# Altium footprint library Selex_PCBLib.PcbLib: 388 footprints (part 22 of 25)
Each footprint in its own frame and in the unit in brackets; x right, y up, seen from the top. Pads: shape width x height; smd on the part's side, far side on the other; paste and mask are expansions set on the pad; w line width, h text height; cw(c..) or ccw(c..) is an arc to the next point about the centre after c.
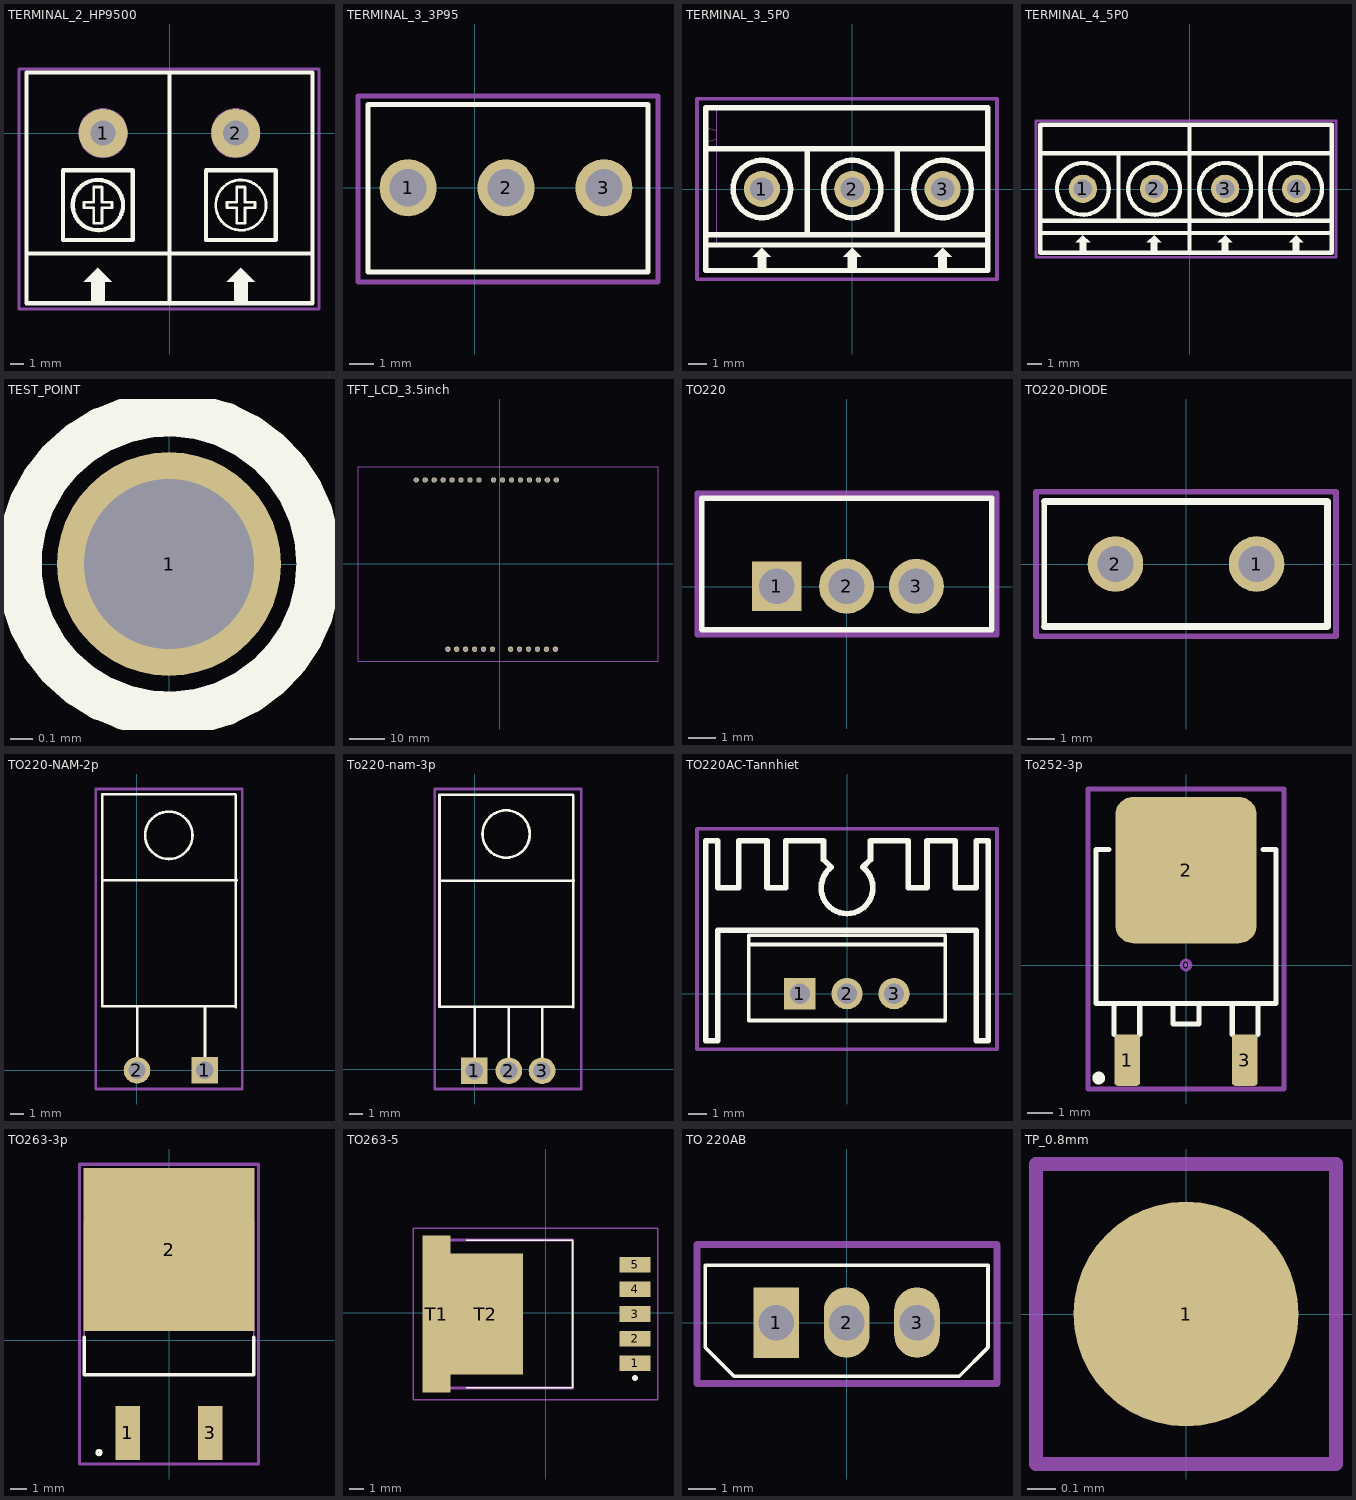
[diagram p21: the footprints below, top view; thin cyan lines are the x and y axes]

## TERMINAL_2_HP9500 [mm]
pads (2):
  round 3.5 hole 1.8 mask+0.05: 1(-4.77,0) 2(4.73,0)
Top Overlay:
  circle w0.3: c-5.145,-5.15 r1.803
  circle w0.2: c5.105,-5.15 r1.803
  rectangle: 4.605,-12.15 5.605,-10.45
  rectangle: -5.645,-12.15 -4.645,-10.45
  region: 5.105,-9.65 4.105,-10.65 6.105,-10.65
  region: -5.145,-9.65 -6.145,-10.65 -4.145,-10.65
  lines w0.2: -6.145,-5.35 -5.445,-5.35 -5.445,-6.45 -4.845,-6.45 -4.845,-5.35 -4.145,-5.35 -4.145,-4.95 -4.845,-4.95 -4.845,-4.15 -4.845,-3.85 -5.445,-3.85 -5.445,-4.95 -6.145,-4.95 -6.145,-5.35 ; 4.105,-5.35 4.105,-4.95 4.805,-4.95 4.805,-3.85 5.405,-3.85 5.405,-4.15 5.405,-4.95 6.105,-4.95 6.105,-5.35 5.405,-5.35 5.405,-6.45 4.805,-6.45 4.805,-5.35 4.105,-5.35
  lines w0.3: -10.27,-8.62 10.23,-8.62 ; -0.02,4.35 -0.02,-12.19 ; -0.02,-12.19 10.23,-12.19 10.23,4.35 -10.27,4.35 -10.27,-12.19 -0.02,-12.19 ; -7.645,-7.65 -7.645,-2.65 -2.645,-2.65 -2.645,-7.65 -7.645,-7.65 ; 2.605,-7.65 7.605,-7.65 7.605,-2.65 2.605,-2.65 2.605,-7.65
Mechanical 1:
  circle w0.05: c4.73,0 r1.75
  circle w0.05: c-4.77,0 r1.75
  lines w0.05: -10.27,-12.19 10.23,-12.19 10.23,4.35 -10.27,4.35 -10.27,-12.19
Mechanical 15:
  lines w0.2: -10.8,-12.6 10.7,-12.6 10.7,4.6 -10.8,4.6 -10.8,-12.6
3D body "User Library-Screw terminal block 9_5mm.step": height 19.5, standoff -4, extent -10.545,-12.15 10.505,4.35

## TERMINAL_3_3P95 [mm]
pads (3):
  round 2.3 hole 1.5: 1(-2.68,0) 2(1.27,0) 3(5.22,0)
Top Overlay:
  lines w0.2: -4.3,-3.4 -4.3,3.35 7,3.35 7,-3.4 -4.3,-3.4
Mechanical 15:
  lines w0.2: -4.7,-3.8 -4.7,3.7 7.4,3.7 7.4,-3.8 -4.7,-3.8
3D body "DG350-3.96-03P-12-00AH.STEP": height 8.4, standoff -3.5, extent -4.4,-3.45 7.1,3.35

## TERMINAL_3_5P0 [mm]
pads (3):
  round 2 hole 1.3 mask+0.1: 1(-5.01,0) 2(-0.01,0) 3(4.99,0)
Top Overlay:
  circle w0.3: c4.99,0 r1.587
  circle w0.3: c-0.01,0 r1.587
  circle w0.3: c-5.01,0 r1.587
  rectangle: -0.26,-4.508 0.24,-3.758
  rectangle: 4.74,-4.508 5.24,-3.758
  rectangle: -5.26,-4.508 -4.76,-3.758
  region: -0.51,-3.758 -0.01,-3.258 0.49,-3.758
  region: 4.49,-3.758 4.99,-3.258 5.49,-3.758
  region: -5.51,-3.758 -5.01,-3.258 -4.51,-3.758
  lines w0.3: -8.11,-2.54 7.49,-2.54 ; -8.11,2.222 7.49,2.222 ; -2.51,-2.5 -2.51,2.222 ; 2.49,-2.54 2.49,2.222 ; -8.11,-3.1 -8.11,-4.508 7.49,-4.508 7.49,-3.1 ; -8.11,-3.1 -8.11,4.5 7.49,4.5 7.49,-3.1 ; -8.11,-3.1 7.49,-3.1
Mechanical 1:
  circle w0.2: c-5.01,0 r1.587
  circle w0.05: c-0.01,0 r1.587
  circle w0.05: c4.99,0 r1.587
  lines w0.05: -7.51,-2.54 7.49,-2.54 ; -7.51,2.222 7.49,2.222 ; -7.51,2.786 -8.11,2.595 -8.11,3.421 -7.51,3.23 ; -2.51,-2.54 -2.51,2.222 ; 2.49,-2.5 2.49,2.222 ; -7.51,-3.1 -7.51,4.5 7.49,4.5 7.49,-3.1 -7.51,-3.1
  text "1" at -5.201,-0.572 h1.2
  text "2" at -0.375,-0.572 h1.2
  text "3" at 4.578,-0.572 h1.2
Mechanical 15:
  lines w0.2: -8.6,-5 8,-5 8,5 -8.6,5 -8.6,-5
3D body "User Library-Terminal-Screw-3A-3way.STEP": height 10, standoff -3, extent -8.11,-3.1 7.49,4.5

## TERMINAL_4_5P0 [mm]
pads (4):
  round 2 hole 1.3 mask+0.1: 1(-7.5,0.01) 2(-2.5,0.01) 3(2.5,0.01) 4(7.5,0.01)
Top Overlay:
  circle w0.3: c7.5,0.01 r1.82
  circle w0.3: c2.5,0.01 r1.82
  circle w0.3: c-7.5,0.01 r1.82
  circle w0.3: c-2.5,0.01 r1.82
  rectangle: 7.25,-4.49 7.75,-3.74
  rectangle: 2.25,-4.49 2.75,-3.74
  rectangle: -2.75,-4.49 -2.25,-3.74
  rectangle: -7.75,-4.49 -7.25,-3.74
  region: 7,-3.74 7.5,-3.24 8,-3.74
  region: 2,-3.74 2.5,-3.24 3,-3.74
  region: -3,-3.74 -2.5,-3.24 -2,-3.74
  region: -8,-3.74 -7.5,-3.24 -7,-3.74
  lines w0.3: -10.5,-2.24 10,-2.24 ; -10.5,2.51 10,2.51 ; -5,-2.24 -5,2.51 ; 0,-4.49 0,-3.09 0,4.51 ; 5,-2.24 5,2.51 ; 10,-3.09 -10.5,-3.09 ; -10.5,-3.09 -10.5,4.51 10,4.51 10,-4.49 -10.5,-4.49 -10.5,-3.09
Mechanical 1:
  circle w0.05: c7.5,0.01 r1.82
  circle w0.05: c2.5,0.01 r1.82
  circle w0.05: c-7.5,0.01 r1.82
  circle w0.05: c-2.5,0.01 r1.82
  lines w0.05: -10.5,-2.24 10,-2.24 ; -10.5,2.51 10,2.51 ; -5,-2.24 -5,2.51 ; 0,-3.09 0,4.51 ; -10.5,-3.09 -10.5,4.51 10,4.51 10,-3.09 -10.5,-3.09
  text "4" at 7.13,-0.46 h1.2
  text "3" at 2.1,-0.54 h1.2
  text "1" at -7.691,-0.561 h1.2
  text "2" at -2.801,-0.561 h1.2
Mechanical 15:
  lines w0.2: -10.8,-4.8 10.3,-4.8 10.3,4.8 -10.8,4.8 -10.8,-4.8
3D body "User Library-Terminal-Screw-3A-2way.STEP": height 10, standoff -3, extent -10.6,-3.028 0,4.572
3D body "User Library-Terminal-Screw-3A-2way.STEP": height 10, standoff -3, extent -0.6,-3.028 10,4.572

## TEST_POINT [mm]
pads (1):
  round 1 hole 0.762: 1(0,0)
Top Overlay:
  circle w0.2: c0,0 r0.671

## TFT_LCD_3.5inch [mil]
pads (28):
  round 60 hole 40.16: 1(-930.8,937.43) 2(-830.8,937.43) 3(-730.8,937.43) 4(-630.8,937.43) 5(-530.8,937.43) 6(-430.8,937.43) 7(-330.8,937.43) 8(-230.8,937.43) 9(-68.2,937.43) 10(31.8,937.43) 11(131.8,937.43) 12(231.8,937.43) 13(331.8,937.43) 14(431.8,937.43) 15(531.8,937.43) 16(631.8,937.43) 17(621.56,-949.97) 18(521.56,-949.97) 19(421.56,-949.97) 20(321.56,-949.97) 21(221.56,-949.97) 22(121.56,-949.97) 23(-80.41,-949.97) 24(-180.41,-949.97) 25(-280.41,-949.97) 26(-380.41,-949.97) 27(-480.41,-949.97) 28(-577.65,-949.97)
Internal Plane 1:
  lines w3.94: -1538.95,-1040.69 1528.05,1040.31 ; -1538.95,1041.31 1528.05,-1040.69
Mechanical 7:
  lines w7.87: -1580.41,-1082.69 1766.05,-1082.69 1766.05,1082.66 -1580.41,1082.66 -1580.41,-1082.69
3D body "61300811821.stp": height 335.04, standoff -121.65, extent -128.04,888.22 691.65,986.65
3D body "61300811821.stp": height 335.04, standoff -121.65, extent -990.64,888.22 -170.95,986.65
3D body: height 511.81, standoff 433.07, extent -1580.41,-1082.69 1766.05,1083.31
3D body "61300611821.stp": height 335.04, standoff -121.65, extent 62.59,-1000.53 682.28,-902.11
3D body "61300611821.stp": height 335.04, standoff -121.65, extent -638.41,-999.53 -18.72,-901.11
3D body: height 590.55, standoff 511.81, extent 1726.68,-1082.69 1766.05,-885.84
3D body: height 590.55, standoff 511.81, extent 1726.68,885.81 1766.05,1082.66
3D body: height 590.55, standoff 511.81, extent -1580.41,1043.29 1766.05,1082.66
3D body: height 590.55, standoff 511.81, extent -1580.41,-1082.69 1766.05,-1043.32
3D body: height 590.55, standoff 472.44, extent -1580.41,-1082.69 -1541.04,1082.66
3D body: height 590.55, standoff 511.81, extent -1538.95,-1040.69 1528.05,1041.31
3D body: height 590.55, standoff 511.81, extent 1531.17,-1042.69 1721.05,1037.31

## TO220 [mm]
pads (3):
  rect 1.8x1.8 hole 1.3 mask+0.05: 1(-2.54,0.01)
  round 2 hole 1.3 mask+0.05: 2(0,0.01) 3(2.54,0.01)
Top Overlay:
  lines w0.2: -5.27,-1.58 -5.27,3.22 5.28,3.22 5.28,-1.58 -5.27,-1.58
Mechanical 1:
  lines w0.05: -5.31,3.26 -5.31,-1.54 5.29,-1.54 5.29,3.26
  lines w0.2: -5.31,3.26 5.29,3.26
Mechanical 15:
  lines w0.2: -5.45,-1.75 -5.45,3.39 5.48,3.39 5.48,-1.75 -5.45,-1.75
3D body "bt136-600.stp": height 22.76, standoff -8.23, extent -5.335,-1.62 5.335,3.21

## TO220-DIODE [mm]
pads (2):
  round 2 hole 1.3 paste+0.1: 1(2.54,0) 2(-2.54,0)
Top Overlay:
  lines w0.2: -5.1,-2.25 -5.1,2.25
  lines w0.254: -5.1,-2.25 5.1,-2.25 5.1,2.25 -5.1,2.25
Mechanical 15:
  lines w0.2: -5.4,-2.6 -5.4,2.6 5.4,2.6 5.4,-2.6 -5.4,-2.6
3D body "User Library-TO220-2_V-L.STEP": height 19.5, standoff -10, extent -5.051,-2.229 4.949,2.271

## TO220-NAM-2p [mm]
pads (2):
  rect 2x2 hole 1.3 paste+0.1: 1(5.08,0)
  round 2 hole 1.3 paste+0.1: 2(0,0)
Top Overlay:
  circle w0.2: c2.388,17.628 r1.775
  lines w0.2: -2.616,14.25 6.834,14.25 7.466,14.25 7.468,14.249 ; 0.025,0.127 0.025,4.724 ; 5.105,0.076 5.105,4.673 ; 6.984,4.8 -2.616,4.8 ; 7.384,4.8 -2.616,4.8 ; 7.417,4.749 7.417,20.649 7.366,20.7 -2.616,20.7 -2.616,4.8
Mechanical 15:
  lines w0.2: -3.1,-1.4 7.9,-1.4 7.9,21.1 -3.1,21.1 -3.1,-1.4
3D body "User Library-TO220-2_OR-INV.STEP": height 2.72, standoff -5.5, extent -2.616,0.132 7.384,20.732

## To220-nam-3p [mm]
pads (3):
  rect 2x2 hole 1.3 paste+0.1: 1(-0.025,-0.127)
  round 2 hole 1.3 paste+0.1: 2(2.565,-0.127) 3(5.055,-0.127)
Top Overlay:
  circle w0.2: c2.358,17.623 r1.775
  lines w0.2: -2.642,14.123 6.808,14.123 7.441,14.123 7.442,14.122 ; 0,0 0,4.597 ; 2.565,-0.127 2.565,4.673 ; 5.08,-0.051 5.08,4.546 ; 6.958,4.673 -2.642,4.673 ; 7.358,4.673 -2.642,4.673 ; 7.391,4.622 7.391,20.522 7.341,20.573 -2.642,20.573 -2.642,4.673
Mechanical 15:
  lines w0.2: -3,-1.5 -3,21 8,21 8,-1.5 -3,-1.5
3D body "User Library-to-220-ab-2.STEP": height 3.71, standoff -5, extent -2.235,-0.429 7.665,19.251

## TO220AC-Tannhiet [mm]
pads (3):
  rect 1.7x1.7 hole 1.1: 1(-2.54,0)
  round 1.7 hole 1.1: 2(0,0) 3(2.54,0)
Top Overlay:
  lines w0.2: -5.3,2.65 5.3,2.65 ; -5.3,-1.45 -5.3,3.15 5.3,3.15 5.3,-1.45 -5.3,-1.45
  lines w0.305: -0.864,6.833 -1.27,7.239 -1.27,8.255 -3.302,8.255 -3.302,5.715 -4.318,5.715 -4.318,8.255 -5.842,8.255 -5.842,5.715 -6.985,5.715 -6.985,8.255 -7.62,8.255 -7.62,-2.54 -6.985,-2.54 -6.985,3.429 6.985,3.429 6.985,-2.54 7.62,-2.54 7.62,8.255 6.985,8.255 6.985,5.715 5.842,5.715 5.842,8.255 4.318,8.255 4.318,5.715 3.302,5.715 3.302,8.255 1.27,8.255 1.27,7.239 0.853,6.822 ; -0.854,6.82 ccw(c0,5.715) 0.858,6.818
Mechanical 15:
  lines w0.2: -8.1,-3 -8.1,8.9 8.1,8.9 8.1,-3 -8.1,-3

## To252-3p [mm]
pads (4):
  round 0.5 on Mech15: 0(0,0)
  rrect25% 1x2 smd: 1(-2.285,-3.7) 3(2.285,-3.7)
  rrect25% 5.5x5.7 smd: 2(0,3.7)
Top Overlay:
  circle w0.25: c-3.4,-4.4 r0.125
  lines w0.2: -3,4.5 -3.5,4.5 -3.5,-1.5 3.5,-1.5 3.5,4.5 3,4.5 ; -2.8,-2.7 -2.8,-1.5 -1.8,-1.5 -1.8,-2.7 ; 1.8,-2.7 1.8,-1.5 2.8,-1.5 2.8,-2.7 ; -0.5,-2.3 -0.5,-1.5 0.5,-1.5 0.5,-2.3 -0.5,-2.3
Mechanical 15:
  lines w0.2: -3.81,-4.826 -3.81,6.858 3.81,6.858 3.81,-4.826 -3.81,-4.826
3D body "DPAK.stp": height 2.31, standoff 0, extent -3.3,-3.951 3.3,5.762

## TO263-3p [mm]
pads (3):
  rect 1.5x3.3 smd: 1(-2.54,-5.689) 3(2.54,-5.689)
  rect 10.5x10 smd: 2(0,5.562)
Top Overlay:
  circle w0.2: c-4.3,-6.9 r0.125
  lines w0.2: -5.2,0.175 -5.2,-2.125 5.2,-2.125 5.2,0.175
Mechanical 13:
  lines w0.1: -5.2,-2.125 5.2,-2.125 5.2,7.275 -5.2,7.275 -5.2,-2.125
Mechanical 15:
  lines w0.2: -0.5,1.275 0.5,1.275 ; 0,0.775 0,1.775 ; -5.5,-7.6 5.5,-7.6 5.5,0.6 5.5,10.8 -5.5,10.8 -5.5,-7.6
3D body "to-263.STEP": height 4.3, standoff 0, extent -5,-6.203 5,9.677

## TO263-5 [mm] "LM2576-SMD"
pads (7):
  rect 2.16x1.07 smd: 1(6.145,-3.5) 2(6.145,-1.8) 3(6.145,-0.1) 4(6.145,1.6) 5(6.145,3.3)
  rect 1.91x10.8 smd: T1(-7.5,-0.1)
  rect 5.08x8.33 smd: T2(-4.1,-0.1)
Top Overlay:
  lines w0.1: -5.463,-5.18 1.858,-5.18 1.858,4.98 -5.463,4.98
  lines w0.2: 6.037,-4.5 cw(c6.137,-4.5) 6.237,-4.5 cw(c6.137,-4.5) 6.037,-4.5
Mechanical 13:
  lines w0.2: -6.783,-5.18 -6.783,4.98 1.858,4.98 1.858,-5.18 -6.783,-5.18
Mechanical 15:
  lines w0.1: -9.1,-6 -9.1,5.8 7.725,5.8 7.725,-6 -9.1,-6
3D body "SW3dPS-TO263-5.STEP": height 4.79, standoff -0.01, extent -8.58,-5.1 7.09,4.9

## TO 220AB [mil]
pads (3):
  rect 65x100 hole 50: 1(-100,0)
  oval 65x100 hole 50: 2(0,0) 3(100,0)
Top Overlay:
  lines w5: -200.79,81.48 -200.79,-35.21 -160,-76 ; -200.79,81.69 200.79,81.69 ; -200,-36 -160,-76 ; 200,-36 160,-76 ; 200.79,81.48 200.79,-35.21 160,-76 ; -160,-76 160,-76
Mechanical 7:
  lines w10: -212.6,-86.61 213.58,-86.61 213.58,111.22 -212.6,111.22 -212.6,-86.61
3D body "TO-220.stp": height 768.3, standoff -133.87, extent -200.6,-74 200.6,103.16

## TP_0.8mm [mm] "Surface"
pads (1):
  round 0.8 smd: 1(0,0)
Mechanical 15:
  lines w0.05: -0.533,-0.533 0.533,-0.533 0.533,0.533 -0.533,0.533 -0.533,-0.533